# Altium footprint library RDM_ALT_PCB.PcbLib: 129 footprints (part 4 of 9)
Each footprint in its own frame and in the unit in brackets; x right, y up, seen from the top. Pads: shape width x height; smd on the part's side, far side on the other; paste and mask are expansions set on the pad; w line width, h text height; cw(c..) or ccw(c..) is an arc to the next point about the centre after c.
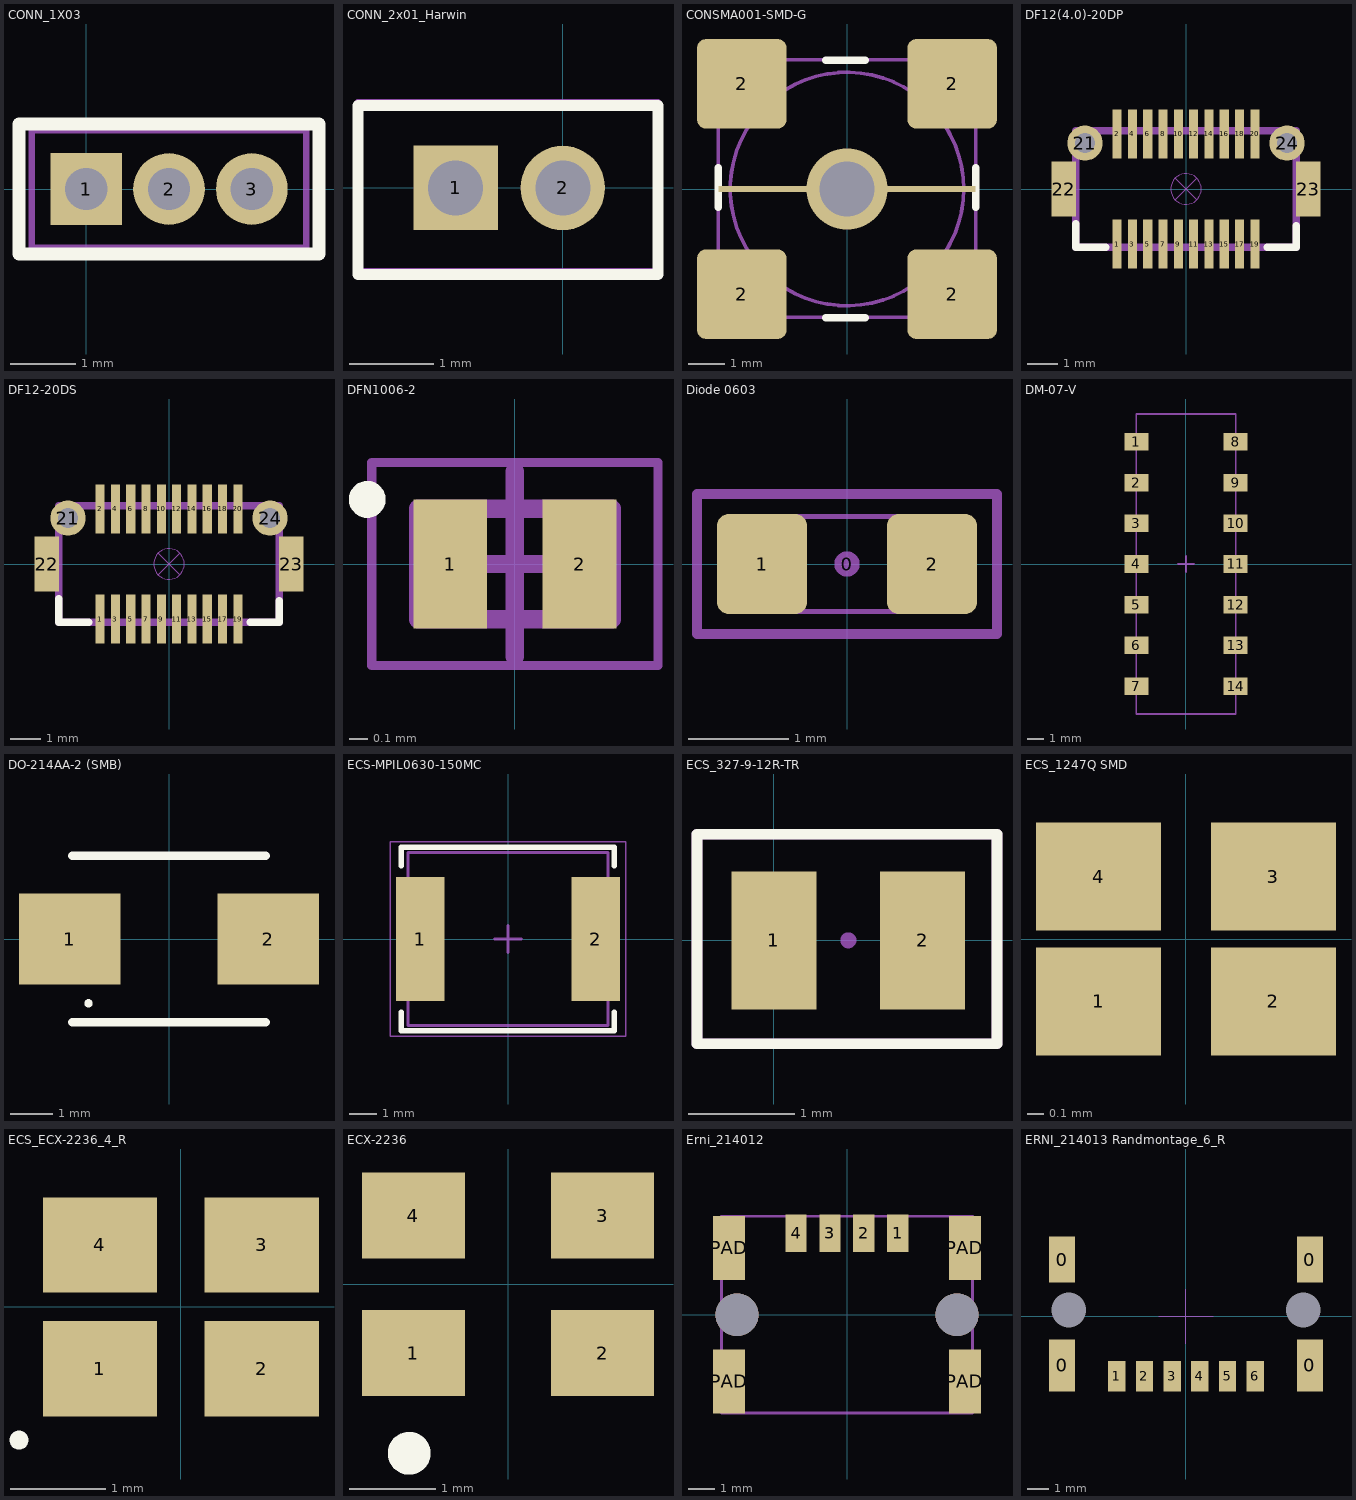
[diagram p3: the footprints below, top view; thin cyan lines are the x and y axes]

## CONN_1X03 [mm] "Connector; Header; 3 Position"
pads (3):
  rect 1.1x1.1 hole 0.65: 1(0,0)
  round 1.1 hole 0.65: 2(1.27,0) 3(2.54,0)
Top Overlay:
  lines w0.2: -1.03,-1 3.57,-1 3.57,1 -1.03,1 -1.03,-1
Mechanical 13:
  lines w0.1: -0.835,-0.9 -0.835,0.9 3.375,0.9 3.375,-0.9 -0.835,-0.9 ; -0.25,-0.075 0.25,-0.075 0.25,0.075 -0.25,0.075 -0.25,-0.075 ; 1.02,-0.075 1.52,-0.075 1.52,0.075 1.02,0.075 1.02,-0.075 ; 2.29,-0.075 2.79,-0.075 2.79,0.075 2.29,0.075 2.29,-0.075
Mechanical 15:
  lines w0.01: -0.25,0.075 0.25,-0.075 ; 1.02,0.075 1.52,-0.075 ; 2.29,0.075 2.79,-0.075
3D body: height 0, standoff -2.25, extent 2.29,-0.075 2.79,0.075
3D body: height 0, standoff -2.25, extent 1.02,-0.075 1.52,0.075
3D body: height 0, standoff -2.25, extent -0.25,-0.075 0.25,0.075
3D body: height 4.4, standoff 0.15, extent -0.835,-0.9 3.375,0.9

## CONN_2x01_Harwin [mm] "Connector Header, vertical, 2 Pos, Pitch 1.27mm"
pads (2):
  rect 1x1 hole 0.65: 1(-1.27,0)
  round 1 hole 0.65: 2(0,0)
Top Overlay:
  lines w0.127: -2.425,-1.025 -2.425,0.975 1.125,0.975 1.125,-1.025 -2.425,-1.025
Mechanical 13:
  lines w0.1: -2.425,-1 1.125,-1 1.125,1 -2.425,1 -2.425,-1 ; -1.47,-0.2 -1.07,-0.2 -1.07,0.2 -1.47,0.2 -1.47,-0.2 ; -0.2,-0.2 -0.2,0.2 0.2,0.2 0.2,-0.2 -0.2,-0.2
Mechanical 15:
  lines w0.01: -1.52,0.075 -1.02,-0.075 ; -0.25,0.075 0.25,-0.075
  lines w0.1: -2.425,-1 -2.425,0.975 1.125,0.975 ; -2.4,-1.025 1.125,-1.025 ; 1.126,-1.024 1.126,0.974
3D body: height 5.3, standoff -3.3, extent -1.47,-0.2 -1.07,0.2
3D body: height 5.3, standoff -3.3, extent -0.2,-0.2 0.2,0.2
3D body "14357.stp": height 5.06, standoff 0.01, extent -2.6,-0.95 1.3,0.95
3D body: height 0, standoff -1, extent -2.426,-1.05 1.126,1.05

## CONSMA001-SMD-G [mm]
pads (5):
  rect 7x0.15 smd: 1(0,0)
  rrect20% 2.44x2.44 smd: 2(-2.86,-2.86) 2(-2.86,2.86) 2(2.86,-2.86) 2(2.86,2.86)
via 0,0 diameter 2.2 hole 1.5
Top Overlay:
  lines w0.2: -3.5,-0.5 -3.5,0.58 ; -0.58,-3.5 0.5,-3.5 ; -0.58,3.5 0.5,3.5 ; 3.5,-0.5 3.5,0.58
Mechanical 13:
  circle w0.1: c0,0 r3.175
  lines w0.1: -3.5,2.013 -2,2.013 -2,3.513 ; 2,3.513 2,2.013 3.5,2.013 ; 3.5,-1.987 2,-1.987 2,-3.487 -2,-3.487 -2,-1.987 -3.5,-1.987 -3.5,-3.487 ; -3.5,-3.487 3.5,-3.487 3.5,3.513 -3.5,3.513 -3.5,-3.487
3D body "SMA-J-P-H-ST-MT1.stp": height 10.55, standoff 0, extent -3.175,-3.175 3.175,3.175

## DF12(4.0)-20DP [mm]
pads (24):
  rect 0.3x1.6 smd: 1(-2.25,-1.8) 2(-2.25,1.8) 3(-1.75,-1.8) 4(-1.75,1.8) 5(-1.25,-1.8) 6(-1.25,1.8) 7(-0.75,-1.8) 8(-0.75,1.8) 9(-0.25,-1.8) 10(-0.25,1.8) 11(0.25,-1.8) 12(0.25,1.8) 13(0.75,-1.8) 14(0.75,1.8) 15(1.25,-1.8) 16(1.25,1.8) 17(1.75,-1.8) 18(1.75,1.8) 19(2.25,-1.8) 20(2.25,1.8)
  round 1.15 hole 0.65: 21(-3.3,1.5) 24(3.3,1.5)
  rect 0.8x1.8 smd: 22(-4,0) 23(4,0)
Top Overlay:
  lines w0.254: -3.6,-1.135 -3.6,-1.9 -2.62,-1.9 ; 2.666,-1.9 3.6,-1.9 3.6,-1.2
Mechanical 13:
  circle w0.02: c0,0 r0.5
  lines w0.02: -0.35,-0.35 0.35,0.35 ; -0.35,0.35 0.35,-0.35
Mechanical 15:
  lines w0.254: -3.6,-1.9 3.6,-1.9 3.6,1.9 -3.6,1.9 -3.6,-1.9
3D body: height 8.83, standoff 0.73, extent -2,13.5 -2,13.5
3D body "DF12(3.5)-20DP-0.5V.stp": height 2.81, standoff -0.59, extent -4.05,-2.3 4.05,2.3

## DF12-20DS [mm]
pads (24):
  rect 0.3x1.6 smd: 1(-2.25,-1.8) 2(-2.25,1.8) 3(-1.75,-1.8) 4(-1.75,1.8) 5(-1.25,-1.8) 6(-1.25,1.8) 7(-0.75,-1.8) 8(-0.75,1.8) 9(-0.25,-1.8) 10(-0.25,1.8) 11(0.25,-1.8) 12(0.25,1.8) 13(0.75,-1.8) 14(0.75,1.8) 15(1.25,-1.8) 16(1.25,1.8) 17(1.75,-1.8) 18(1.75,1.8) 19(2.25,-1.8) 20(2.25,1.8)
  round 1.15 hole 0.65: 21(-3.3,1.5) 24(3.3,1.5)
  rect 0.8x1.8 smd: 22(-4,0) 23(4,0)
Top Overlay:
  lines w0.254: -3.6,-1.135 -3.6,-1.9 -2.62,-1.9 ; 2.666,-1.9 3.6,-1.9 3.6,-1.2
Mechanical 13:
  circle w0.02: c0,0 r0.5
  lines w0.01: -0.35,-0.35 0.35,0.35 ; -0.35,0.35 0.35,-0.35
Mechanical 15:
  lines w0.254: -3.6,-1.9 -3.6,1.9 3.6,1.9 3.6,-1.9 -3.6,-1.9
3D body "DF12-20DS-0.5V.stp": height 2.7, standoff -0.6, extent -4.05,-2.3 4.05,2.3

## DFN1006-2 [mm] "DFN, 2-Leads, Body 0.57x1.00mm, Pitch 0.65mm, IPC Medium Density"
height 0.53
pads (2):
  rect 0.4x0.7 smd: 1(-0.35,0) 2(0.35,0)
Top Overlay:
  circle w0.1: c-0.8,0.35 r0.05
Mechanical 13:
  lines w0.1: -0.525,-0.3 -0.525,0.3 0.525,0.3 0.525,-0.3 -0.525,-0.3
Mechanical 15:
  lines w0.05: -0.775,-0.55 -0.775,0.55 0.775,0.55 0.775,-0.55 -0.775,-0.55
  lines w0.1: -0.5,0 0.5,0 ; 0,-0.5 0,0.5
3D body: height 0.53, standoff 0, extent -0.525,-0.3 0.525,0.3

## Diode 0603 [mm]
pads (3):
  round 0.254 on Mech15: 0(0,0)
  rrect25% 0.9x1 smd: 1(-0.85,0) 2(0.85,0)
Mechanical 13:
  lines w0.05: -0.475,-0.474 0.475,-0.474 ; -0.475,0.474 0.475,0.474 ; -0.875,-0.475 -0.875,0.475 -0.475,0.475 -0.475,-0.475 -0.875,-0.475 ; 0.475,-0.475 0.875,-0.475 0.875,0.475 0.475,0.475 0.475,-0.475
Mechanical 15:
  lines w0.1: -1.5,-0.7 1.5,-0.7 1.5,0.7 -1.5,0.7 -1.5,-0.7

## DM-07-V [mm] "DIP Switch 7 Position"
height 3.7
pads (14):
  rect 1.5x1.1 smd: 1(-3.1,7.62) 2(-3.1,5.08) 3(-3.1,2.54) 4(-3.1,0) 5(-3.1,-2.54) 6(-3.1,-5.08) 7(-3.1,-7.62) 8(3.1,7.62) 9(3.1,5.08) 10(3.1,2.54) 11(3.1,0) 12(3.1,-2.54) 13(3.1,-5.08) 14(3.1,-7.62)
Mechanical 13:
  lines w0.1: -3.1,-9.36 3.1,-9.36 3.1,9.36 -3.1,9.36 -3.1,-9.36
Mechanical 15:
  lines w0.1: -0.5,0 0.5,0 ; 0,-0.5 0,0.5
3D body: height 3.7, standoff 0.7, extent -3.1,-9.36 3.1,9.36

## DO-214AA-2 (SMB) [mm]
pads (2):
  rect 2.4x2.16 smd: 1(-2.35,0) 2(2.35,0)
Top Overlay:
  circle w0.2: c-1.905,-1.524 r0
  lines w0.2: -2.285,-1.97 2.285,-1.97 ; -2.285,1.97 2.285,1.97
3D body "tisp4240m3bj.stp": height 2.13, standoff 0, extent -2.7,-1.81 2.7,1.81

## ECS-MPIL0630-150MC [mm] "Fixed Inductors 15uH +/-20% 5A Iron Core Shielded"
height 3
pads (2):
  rect 1.8x4.6 smd: 1(-3.25,0) 2(3.25,0)
Top Overlay:
  lines w0.2: -3.95,-2.7 -3.95,-3.4 3.925,-3.4 3.925,-2.7 ; -3.95,2.7 -3.95,3.4 3.925,3.4 3.925,2.7
Mechanical 13:
  lines w0.1: -3.7,-3.2 -3.7,3.2 3.7,3.2 3.7,-3.2 -3.7,-3.2
Mechanical 15:
  lines w0.05: -4.35,-3.6 -4.35,3.6 4.35,3.6 4.35,-3.6 -4.35,-3.6
  lines w0.1: -0.5,0 0.5,0 ; 0,-0.5 0,0.5
3D body: height 0.25, standoff 0, extent -0.1,1.35 -0.1,1.35
3D body: height 0.25, standoff 0, extent 0,0 0,0
3D body: height 3, standoff 0.1, extent -3.7,-3.2 3.7,3.2

## ECS_327-9-12R-TR [mm] "SMD CRYSTAL 32.7680KHZ"
height 0.6
pads (2):
  rect 0.8x1.3 smd: 1(0,0) 2(1.4,0)
Top Overlay:
  lines w0.1: -0.725,-0.975 2.1,-0.975 2.1,1 -0.725,1 -0.725,-0.975
Mechanical 15:
  circle w0.1: c0.7,0 r0.025
  lines w0.1: -0.725,0.975 -0.7,1 2.1,1 2.1,-0.975 -0.725,-0.975 -0.725,1
3D body "ECS-.327-12.5-12QS-TR--3DModel-STEP-40055.STEP": height 0.61, standoff 0.01, extent -0.3,-0.6 1.7,0.6

## ECS_1247Q SMD [mm] "1.6*1.3mm Footprint"
pads (4):
  rect 0.75x0.65 smd: 1(-0.525,-0.375) 2(0.525,-0.375) 3(0.525,0.375) 4(-0.525,0.375)

## ECS_ECX-2236_4_R [mm] "ECS_ECX-2236_4_R"
height 0.5
pads (4):
  rect 1.2x1 smd: 1(-0.85,-0.65) 2(0.85,-0.65) 3(0.85,0.65) 4(-0.85,0.65)
Top Overlay:
  circle w0.2: c-1.7,-1.4 r0
3D body: height 0.5, standoff 0, extent -1.25,-1 1.25,1

## ECX-2236 [mm] "Quartz Crystal, SM; Body 3.4 x 2.7 mm (LxW max)"
height 0.5
pads (4):
  rect 1.2x1 smd: 1(-1.1,-0.8) 2(1.1,-0.8) 3(1.1,0.8) 4(-1.1,0.8)
Top Overlay:
  circle w0.25: c-1.15,-1.967 r0.125

## Erni_214012 [mm] "Stecker"
height 3
pads (8):
  rect 0.8x1.4 smd: 1(1.905,3.05) 2(0.633,3.05) 3(-0.637,3.05) 4(-1.907,3.05)
  rect 1.2x2.4 smd: PAD(-4.415,-2.5) PAD(-4.415,2.5) PAD(4.415,-2.5) PAD(4.415,2.5)
via -4.115,0 diameter 1.6 hole 1.6
via 4.115,0 diameter 1.6 hole 1.6
Mechanical 15:
  lines w0.1: -4.699,-3.683 -4.699,3.683 4.699,3.683 4.699,-3.683 -4.699,-3.683

## ERNI_214013 Randmontage_6_R [mm] "ERNI_214013 Randmontage_6_R"
height 2.98
pads (12):
  rect 1.2x2.4 smd: 0(-5.685,-2.25) 0(5.685,-2.25)
  rect 1.2x2.12 smd: 0(-5.685,2.61) 0(5.685,2.61)
  round 0 hole 1.6 unplated paste+0 mask+0.102: 0(-5.385,0.3)
  round 0 hole 1.6 unplated: 0(5.385,0.3)
  rect 0.8x1.4 smd: 1(-3.175,-2.75) 2(-1.905,-2.75) 3(-0.635,-2.75) 4(0.635,-2.75) 5(1.905,-2.75) 6(3.175,-2.75)
Mechanical 13:
  lines w0.01: -1.25,0 1.25,0 ; 0,-1.25 0,1.25
3D body "214013.STEP": height 2.96, standoff -0.77, extent -6.495,-3.16 6.205,4.04